# Altium footprint library DrPCB.PcbLib: 910 footprints (part 34 of 57)
Each footprint in its own frame and in the unit in brackets; x right, y up, seen from the top. Pads: shape width x height; smd on the part's side, far side on the other; paste and mask are expansions set on the pad; w line width, h text height; cw(c..) or ccw(c..) is an arc to the next point about the centre after c.
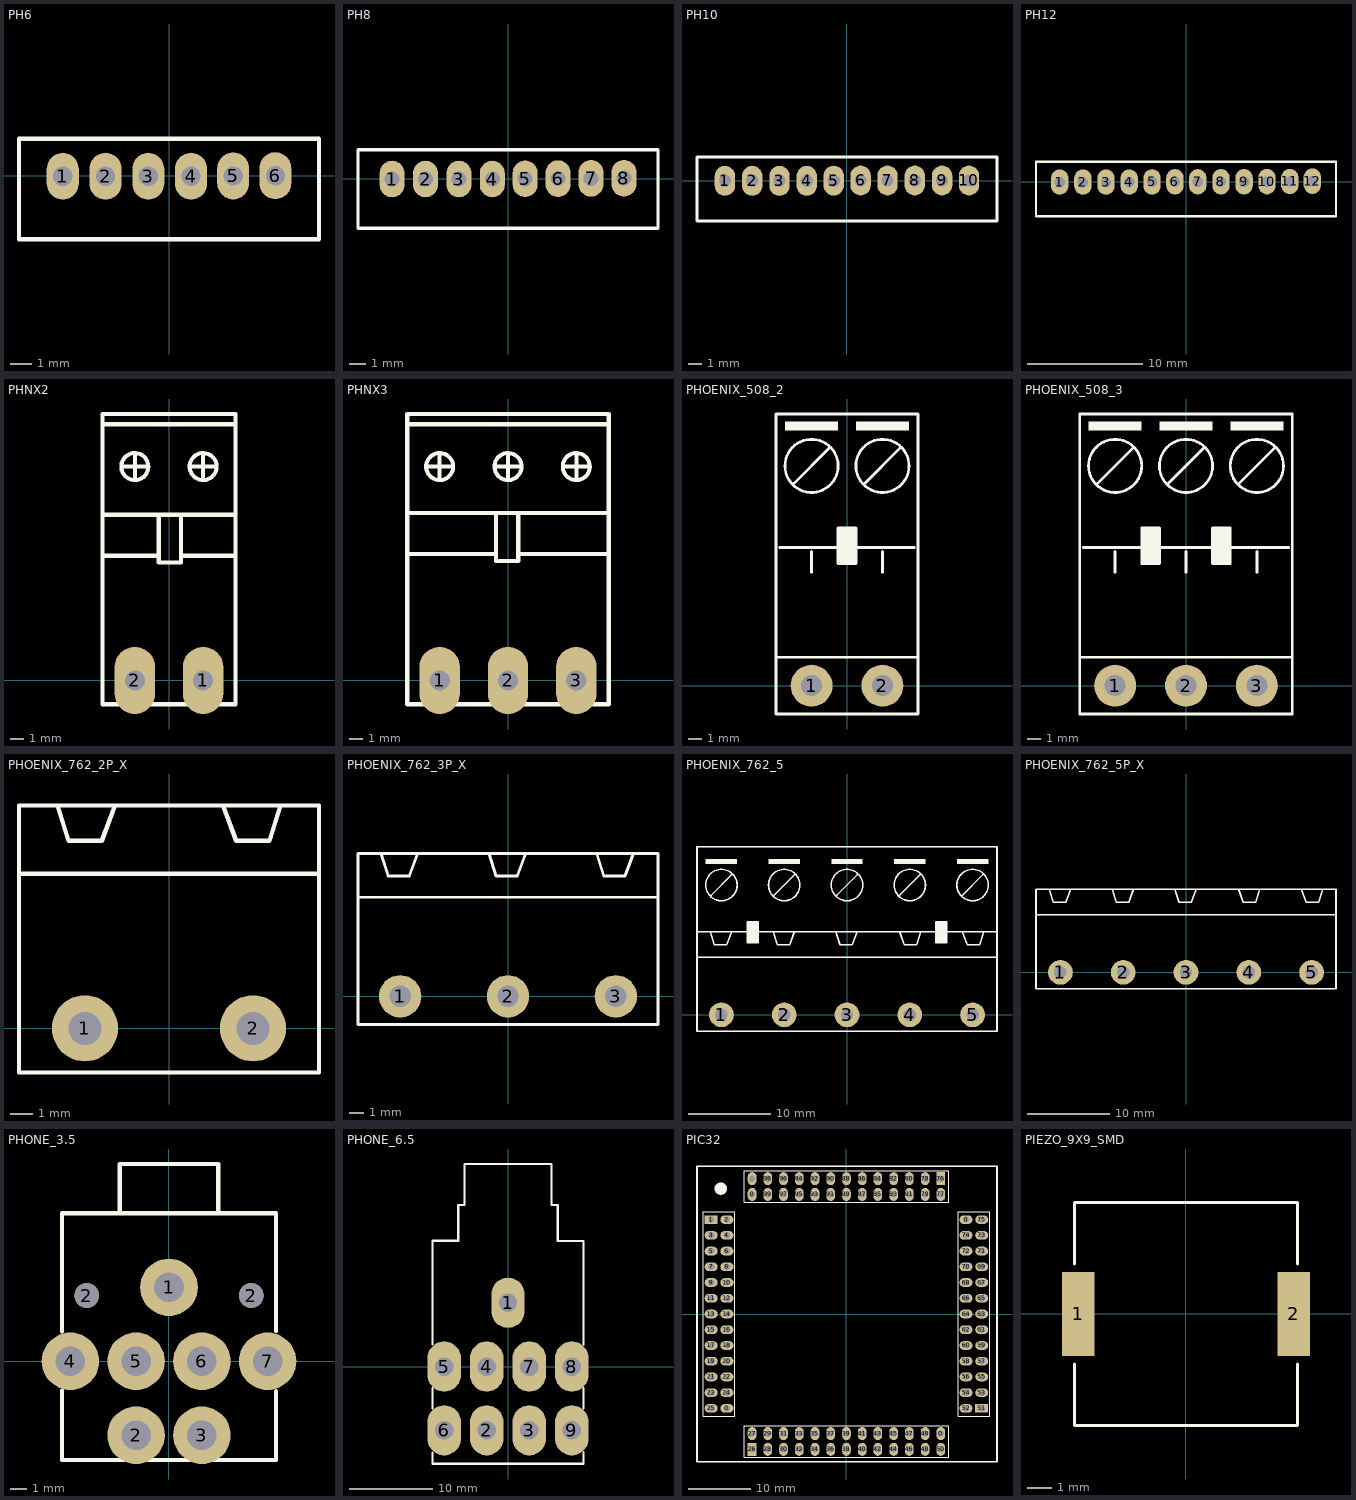
[diagram p33: the footprints below, top view; thin cyan lines are the x and y axes]

## PH6 [mm]
pads (6):
  oval 1.5x2.2 hole 0.9: 1(-4.981,-0.013) 2(-2.978,-0.013) 3(-0.975,-0.013) 4(1.029,-0.013) 5(3.005,0) 6(4.981,0.013)
Top Overlay:
  lines w0.2: -7.031,-2.963 -7.031,1.737 7.026,1.737 7.026,-2.963 -7.031,-2.963
3D body "User Library-PCB HEADER (JST BxB-PH-K-S (VERTICAL)).step": height 6, standoff -1.91, extent -7,-2.863 7,1.637

## PH8 [mm]
pads (8):
  oval 1.5x2.2 hole 0.9: 1(-6.957,-0.025) 2(-4.954,-0.025) 3(-2.951,-0.025) 4(-0.948,-0.025) 5(1.029,-0.013) 6(3.005,0) 7(4.981,0.013) 8(6.957,0.025)
Top Overlay:
  lines w0.2: 8.997,-2.975 -9.007,-2.975 -9.007,1.725 9.002,1.725 9.002,-2.95

## PH10 [mm]
pads (10):
  oval 1.5x2.2 hole 0.9: 1(-8.96,-0.013) 2(-6.957,-0.013) 3(-4.954,-0.013) 4(-2.95,-0.013) 5(-0.974,0) 6(1.002,0.013) 7(2.977,0.013) 8(4.981,0.013) 9(6.984,0.013) 10(8.96,0.013)
Top Overlay:
  lines w0.2: 11.005,1.737 -11.01,1.737 -11.01,-2.963 11.018,-2.963 ; 11.018,-2.912 11.018,1.737
3D body "User Library-PCB HEADER (JST BxB-PH-K-S (VERTICAL)) (3).step": height 6.01, standoff -1.89, extent -11,-2.837 11,1.663

## PH12 [mm]
pads (12):
  oval 1.5x2.2 hole 0.9: 1(-10.923,-0.038) 2(-8.919,-0.038) 3(-6.916,-0.038) 4(-4.913,-0.038) 5(-2.937,-0.025) 6(-0.96,-0.013) 7(1.015,-0.013) 8(3.018,-0.013) 9(5.021,-0.013) 10(6.998,0) 11(8.974,0.013) 12(10.923,0.038)
Top Overlay:
  lines w0.2: 12.967,-2.937 12.967,1.712 -12.973,1.712 -12.973,-2.988 12.969,-2.988
3D body "User Library-PCB HEADER (JST BxB-PH-K-S (VERTICAL)) (2).step": height 6, standoff -1.91, extent -13,-2.863 13,1.637

## PHNX2 [mm]
pads (2):
  oval 3x5 hole 1.5: 1(2.54,0) 2(-2.54,0)
Top Overlay:
  circle w0.3: c-2.54,15.9 r1.006
  circle w0.3: c2.54,15.9 r1.006
  lines w0.3: -4.826,19.05 4.953,19.05 ; -3.404,15.9 -1.702,15.9 ; -2.54,15.062 -2.54,16.688 ; 1.676,15.9 3.378,15.9 ; 2.54,15.062 2.54,16.688
  lines w0.305: -4.953,9.271 -0.762,9.271 ; -4.953,12.319 4.953,12.319 ; -0.762,12.192 -0.762,8.763 0.889,8.763 0.889,12.319 ; 0.889,9.271 4.953,9.271 ; 4.877,-1.778 -4.953,-1.778 -4.953,19.812 4.953,19.812 4.953,-1.778

## PHNX3 [mm]
pads (3):
  oval 3x5 hole 1.5: 1(-5.08,0) 2(0,0) 3(5.08,0)
Top Overlay:
  circle w0.3: c5.08,15.9 r1.006
  circle w0.3: c-5.08,15.9 r1.006
  circle w0.3: c0,15.9 r1.006
  lines w0.3: -7.366,19.05 7.493,19.05 ; -5.944,15.9 -4.242,15.9 ; -5.08,15.062 -5.08,16.688 ; -0.864,15.9 0.838,15.9 ; 0,15.062 0,16.688 ; 4.216,15.9 5.918,15.9 ; 5.08,15.062 5.08,16.688
  lines w0.305: -7.493,9.398 -0.889,9.398 ; -7.493,12.446 7.493,12.446 ; -0.889,12.319 -0.889,8.89 0.762,8.89 0.762,12.446 ; 0.762,9.398 7.493,9.398 ; -7.493,-1.778 7.493,-1.778 7.493,19.812 -7.493,19.812 -7.493,-1.778

## PHOENIX_508_2 [mm] "PHOENIX MSTB 2, 5-G, 5.08mm pitch, 2pin"
pads (2):
  round 3 hole 1.5: 1(-2.54,0) 2(2.54,0)
Top Overlay:
  circle w0.2: c2.54,15.748 r1.905
  circle w0.2: c-2.54,15.748 r1.905
  region: 0.635,11.303 -0.635,11.303 -0.635,8.763 0.635,8.763
  region: 4.445,18.923 0.635,18.923 0.635,18.288 4.445,18.288
  region: -0.635,18.923 -4.445,18.923 -4.445,18.288 -0.635,18.288
  lines w0.2: -5.08,2.032 5.08,2.032 ; -4.826,9.906 4.826,9.906 ; -3.81,14.478 -1.27,17.018 ; -2.54,8.128 -2.54,9.618 ; 1.27,14.478 3.81,17.018 ; 2.54,8.128 2.54,9.618 ; -5.08,-2.032 5.08,-2.032 5.08,19.468 -5.08,19.468 -5.08,-2.032 ; -0.635,8.763 0.635,8.763 0.635,11.303 -0.635,11.303 -0.635,8.763
3D body "PHOENIX_MSTB2W.stp": height 15, standoff 0, extent -5,1 5,19.2
3D body "PHOENIX_MSTB2.stp": height 8.6, standoff -3.5, extent -5,-2 5,10

## PHOENIX_508_3 [mm] "PHOENIX MSTB 2, 5-G, 5.08mm pitch, 3pin"
pads (3):
  round 3 hole 1.5: 1(-5.08,0) 2(0,0) 3(5.08,0)
Top Overlay:
  circle w0.2: c5.08,15.748 r1.905
  circle w0.2: c0,15.748 r1.905
  circle w0.2: c-5.08,15.748 r1.905
  rectangle: -3.175,8.763 -1.905,11.303
  region: 3.175,11.303 1.905,11.303 1.905,8.763 3.175,8.763
  region: 6.985,18.923 3.175,18.923 3.175,18.288 6.985,18.288
  region: 1.905,18.923 -1.905,18.923 -1.905,18.288 1.905,18.288
  region: -3.175,18.923 -6.985,18.923 -6.985,18.288 -3.175,18.288
  lines w0.2: -7.62,2.032 7.62,2.032 ; -7.366,9.906 7.366,9.906 ; -6.35,14.478 -3.81,17.018 ; -5.08,8.128 -5.08,9.618 ; -1.27,14.478 1.27,17.018 ; 0,8.128 0,9.618 ; 3.81,14.478 6.35,17.018 ; 5.08,8.128 5.08,9.618 ; -7.62,-2.032 -7.62,19.468 7.62,19.468 7.62,-2.032 -7.62,-2.032 ; -3.175,8.763 -1.905,8.763 -1.905,11.303 -3.175,11.303 -3.175,8.763 ; 1.905,8.763 3.175,8.763 3.175,11.303 1.905,11.303 1.905,8.763
3D body "PHOENIX_MSTB3w.stp": height 15, standoff 0, extent -7.5,1 7.5,19.2
3D body "PHOENIX_MSTB3.stp": height 8.6, standoff -3.5, extent -7.5,-2 7.5,10

## PHOENIX_762_2P_X [mm] "PHOENIX, GMSTB 2,5/2-G-7,62, 7.62mm pitch, 2pin"
pads (2):
  round 3 hole 1.5: 1(-3.81,0) 2(3.81,0)
Top Overlay:
  lines w0.2: -6.8,7 6.8,7 ; -5.05,10.1 -4.55,8.5 -3.05,8.5 -2.45,10.1 ; 2.45,10.1 3.05,8.5 4.55,8.5 5.05,10.1 ; -6.8,-2 6.8,-2 6.8,10.1 -6.8,10.1 -6.8,-2
3D body "GMSTB-2-5-2-G-7-62_3D.stp": height 9.1, standoff -3, extent -6.72,-1.9 6.72,10.102

## PHOENIX_762_3P_X [mm] "PHOENIX, GMSTB 2,5/3-G-7,62, 7.62mm pitch, 3pin"
pads (3):
  round 3 hole 1.5: 1(-7.62,0) 2(0,0) 3(7.62,0)
Top Overlay:
  lines w0.2: -10.6,7 10.6,7 ; -8.97,10.1 -8.47,8.5 -6.97,8.5 -6.37,10.1 ; -1.35,10.1 -0.85,8.5 0.65,8.5 1.25,10.1 ; 6.27,10.1 6.77,8.5 8.27,8.5 8.87,10.1 ; -10.6,-2 10.6,-2 10.6,10.1 -10.6,10.1 -10.6,-2
3D body "GMSTB-2-5-3-G-7-62_3D.stp": height 9.1, standoff -3, extent -10.53,-1.9 10.53,10.102

## PHOENIX_762_5 [mm] "PHOENIX, GMSTB 2,5/5-G-7,62, 7.62mm pitch, 5pin"
pads (5):
  round 3 hole 1.5: 1(-15.24,0) 2(-7.62,0) 3(0,0) 4(7.62,0) 5(15.24,0)
Top Overlay:
  circle w0.2: c15.24,15.748 r1.905
  circle w0.2: c7.62,15.748 r1.905
  circle w0.2: c0,15.748 r1.905
  circle w0.2: c-7.62,15.748 r1.905
  circle w0.2: c-15.24,15.748 r1.905
  region: -10.795,11.303 -12.065,11.303 -12.065,8.763 -10.795,8.763
  rectangle: 10.795,8.763 12.065,11.303
  region: 17.145,18.923 13.335,18.923 13.335,18.288 17.145,18.288
  region: 9.525,18.923 5.715,18.923 5.715,18.288 9.525,18.288
  region: 1.905,18.923 -1.905,18.923 -1.905,18.288 1.905,18.288
  region: -5.715,18.923 -9.525,18.923 -9.525,18.288 -5.715,18.288
  region: -13.335,18.923 -17.145,18.923 -17.145,18.288 -13.335,18.288
  lines w0.2: -18.2,7 18.2,7 ; -16.59,10.1 -16.09,8.5 -14.59,8.5 -13.99,10.1 ; -16.51,14.478 -13.97,17.018 ; -8.97,10.1 -8.47,8.5 -6.97,8.5 -6.37,10.1 ; -8.89,14.478 -6.35,17.018 ; -1.35,10.1 -0.85,8.5 0.65,8.5 1.25,10.1 ; -1.27,14.478 1.27,17.018 ; 6.35,14.478 8.89,17.018 ; 6.37,10.1 6.97,8.5 8.47,8.5 8.97,10.1 ; 13.97,14.478 16.51,17.018 ; 13.99,10.1 14.59,8.5 16.09,8.5 16.59,10.1 ; -18.2,10.1 18.2,10.1 ; -18.2,10.1 -18.2,-2 18.2,-2 18.2,10.1 ; -18.2,10.1 -18.2,20.4 18.2,20.4 18.2,10.1 ; -12.065,8.763 -12.065,11.303 -10.795,11.303 -10.795,8.763 -12.065,8.763 ; 10.795,8.763 12.065,8.763 12.065,11.303 10.795,11.303 10.795,8.763
3D body "GMSTB-2-5-5-G-7-62_3D.stp": height 9.1, standoff -3, extent -18.15,-1.9 18.15,10.102
3D body "GMSTB-2-5-5-ST-7-62_3D.stp": height 15.5, standoff 0.5, extent -18.05,2 18.05,20.2

## PHOENIX_762_5P_X [mm] "PHOENIX, GMSTB 2,5/5-G-7,62, 7.62mm pitch, 5pin"
pads (5):
  round 3 hole 1.5: 1(-15.24,0) 2(-7.62,0) 3(0,0) 4(7.62,0) 5(15.24,0)
Top Overlay:
  lines w0.2: -18.2,7 18.2,7 ; -16.59,10.1 -16.09,8.5 -14.59,8.5 -13.99,10.1 ; -8.97,10.1 -8.47,8.5 -6.97,8.5 -6.37,10.1 ; -1.35,10.1 -0.85,8.5 0.65,8.5 1.25,10.1 ; 6.37,10.1 6.97,8.5 8.47,8.5 8.97,10.1 ; 13.99,10.1 14.59,8.5 16.09,8.5 16.59,10.1 ; -18.2,-2 18.2,-2 18.2,10.1 -18.2,10.1 -18.2,-2
3D body "GMSTB-2-5-5-G-7-62_3D.stp": height 9.1, standoff -3, extent -18.15,-1.9 18.15,10.102

## PHONE_3.5 [mm]
pads (9):
  round 3.5 hole 1.8: 1(0,4.5) 2(-2,-4.5) 3(2,-4.5) 4(-6,0) 5(-2,0) 6(2,0) 7(6,0)
  round 1.5 hole 1.5: 2(-5,4) 2(5,4)
Top Overlay:
  lines w0.254: -6.5,-1.78 -6.5,-6 6.5,-6 6.5,-1.826 ; -6.5,1.801 -6.5,9 6.5,9 6.5,1.831 ; -3,9 -3,12 ; -2.994,12 3,12 3,9

## PHONE_6.5 [mm]
pads (9):
  oval 4x6 hole 2.2: 1(0,7.62) 2(-2.54,-7.62) 3(2.54,-7.62) 4(-2.54,0) 5(-7.62,0) 6(-7.62,-7.62) 7(2.54,0) 8(7.62,0) 9(7.62,-7.62)
Top Overlay:
  lines w0.254: -9.023,-11.643 -9.023,-10.259 ; -9.023,-5.016 -9.023,-2.591 ; -9.023,2.626 -9.023,15.023 -5.94,15.023 -5.94,19.3 -5.195,19.3 -5.195,24.2 ; -5.163,24.2 5.195,24.2 5.195,19.3 5.94,19.3 5.94,15 9.023,15 9.023,2.603 ; 9.017,-5.016 9.017,-2.591 ; 9.023,-11.62 9.023,-10.236
  lines w0.3: -9,-11.62 9,-11.62

## PIC32 [mm]
pads (104):
  oval 2.1x1.4 hole 1: 0(-19.243,-15.162) 0(19.365,15.318) 2(-19.243,15.318) 3(-21.783,12.778) 4(-19.243,12.778) 5(-21.783,10.238) 6(-19.243,10.238) 7(-21.783,7.698) 8(-19.243,7.698) 9(-21.783,5.158) 10(-19.243,5.158) 11(-21.783,2.618) 12(-19.243,2.618) 13(-21.783,0.078) 14(-19.243,0.078) 15(-21.783,-2.462) 16(-19.243,-2.462) 17(-21.783,-5.002) 18(-19.243,-5.002) 19(-21.783,-7.542) 20(-19.243,-7.542) 21(-21.783,-10.082) 22(-19.243,-10.082) 23(-21.783,-12.622) 24(-19.243,-12.622) 25(-21.783,-15.162) 52(19.365,-15.162) 53(21.905,-12.622) 54(19.365,-12.622) 55(21.905,-10.082) 56(19.365,-10.082) 57(21.905,-7.542) 58(19.365,-7.542) 59(21.905,-5.002) 60(19.365,-5.002) 61(21.905,-2.462) 62(19.365,-2.462) 63(21.905,0.078) 64(19.365,0.078) 65(21.905,2.618) 66(19.365,2.618) 67(21.905,5.158) 68(19.365,5.158) 69(21.905,7.698) 70(19.365,7.698) 71(21.905,10.238) 72(19.365,10.238) 73(21.905,12.778) 74(19.365,12.778) 75(21.905,15.318)
  oval 1.4x2.1 hole 1: 0(-15.179,19.382) 0(15.301,-19.226) 27(-15.179,-19.226) 28(-12.639,-21.766) 29(-12.639,-19.226) 30(-10.099,-21.766) 31(-10.099,-19.226) 32(-7.559,-21.766) 33(-7.559,-19.226) 34(-5.019,-21.766) 35(-5.019,-19.226) 36(-2.479,-21.766) 37(-2.479,-19.226) 38(0.061,-21.766) 39(0.061,-19.226) 40(2.601,-21.766) 41(2.601,-19.226) 42(5.141,-21.766) 43(5.141,-19.226) 44(7.681,-21.766) 45(7.681,-19.226) 46(10.221,-21.766) 47(10.221,-19.226) 48(12.761,-21.766) 49(12.761,-19.226) 50(15.301,-21.766) 77(15.301,19.382) 78(12.761,21.922) 79(12.761,19.382) 80(10.221,21.922) 81(10.221,19.382) 82(7.681,21.922) 83(7.681,19.382) 84(5.141,21.922) 85(5.141,19.382) 86(2.601,21.922) 87(2.601,19.382) 88(0.061,21.922) 89(0.061,19.382) 90(-2.479,21.922) 91(-2.479,19.382) 92(-5.019,21.922) 93(-5.019,19.382) 94(-7.559,21.922) 95(-7.559,19.382) 96(-10.099,21.922) 97(-10.099,19.382) 98(-12.639,21.922) 99(-12.639,19.382) 100(-15.179,21.922)
  rect 2.1x1.4 hole 1: 1(-21.783,15.318) 51(21.905,-15.162)
  rect 1.4x2.1 hole 1: 26(-15.179,-21.766) 76(15.301,21.922)
Top Overlay:
  circle w1: c-20.233,20.322 r0.5
  lines w0.2: -23.053,-16.432 -17.973,-16.432 -17.973,16.588 -23.053,16.588 -23.053,-16.432 ; -16.449,-23.036 -16.449,-17.956 16.571,-17.956 16.571,-23.036 -16.449,-23.036 ; -16.449,18.112 -16.449,23.192 16.571,23.192 16.571,18.112 -16.449,18.112 ; 18.095,-16.432 18.095,16.588 23.175,16.588 23.175,-16.432 18.095,-16.432
  lines w0.254: -24.069,-23.773 -24.069,23.929 24.369,23.929 24.369,-23.773 -24.069,-23.773

## PIEZO_9X9_SMD [mm]
pads (2):
  rect 1.3x3.4 smd: 1(-4.35,0) 2(4.35,0)
Top Overlay:
  lines w0.127: -4.5,-2.02 -4.5,-4.5 4.5,-4.5 4.5,-2.02 ; -4.5,2.02 -4.5,4.5 4.5,4.5 4.5,2.02
3D body "PKMCS0909E4000-R1--3DModel-STEP-56544.STEP": height 1.9, standoff 0, extent -4.5,-4.5 4.5,4.5